# Altium integrated library Weidmueller_OMNIMATE_Signal.IntLib: 2550 symbols (part 1 of 45)
Pins are listed as number, name and electrical type; pins without a type are passive.

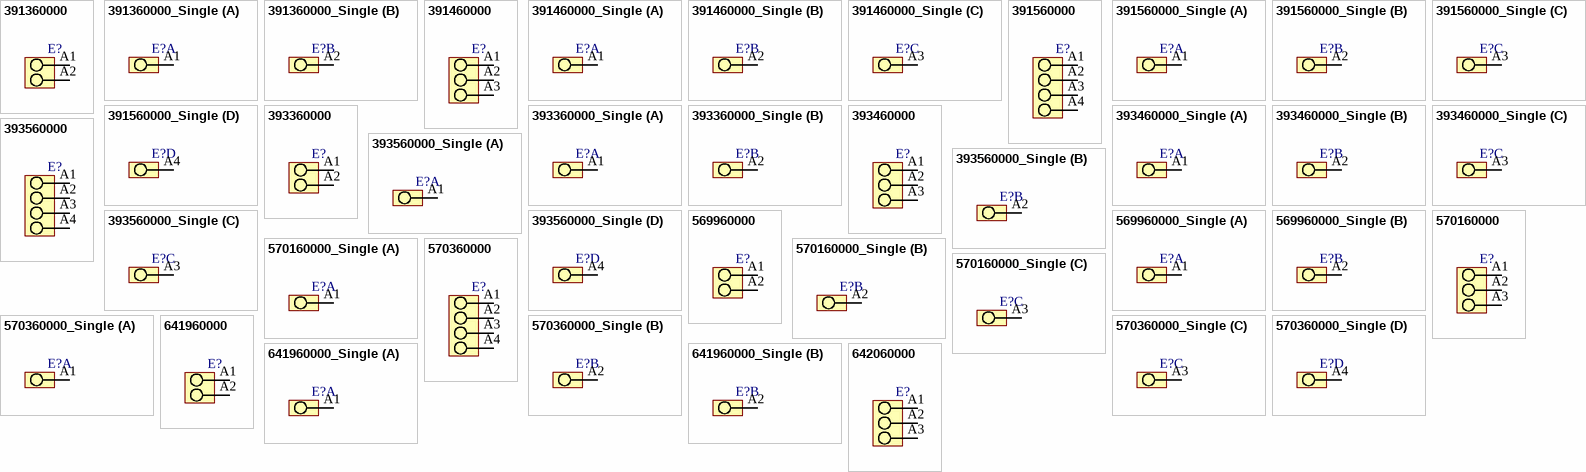
[diagram p0: symbols 391360000 to 642060000]

## 391360000
designator E?
OMNIMATE Signal - series TOP1.5GS; PartNumber: 391360000; Manufacturer: Weidmueller; Short_text_for_material: TOP1.5GS2/180 7 2STI OR; Side_termination_characteristic: closed side; Mounting_onto_the_PCB: Solder connection; Pitch_mm: 7,62 mm; Pitch_inch: 0,3 inch; No_of_poles: 2; Solder_pin_length_mm: 4,5 mm; Contact_material: CuZn; Contact_surface: tinned; Insulating_material: PA; UL_94_flammability_rating: V-2; Rated_voltage_for_surge_voltage_class_pollution_degree_II_2: 1000 V; Solid_min_H05_07_V_U: 0,5 mm²; Solid_max_H05_07_V_U: 2,5 mm²; Rated_voltage_use_group_B_UL_1059: 300 V; Rated_current_use_group_B_UL_1059: 10 A; Wire_cross_section_AWG_min_UL_1059: AWG 26; Wire_cross_section_AWG_max_UL_1059: AWG 14; PackageReference: TOP_1_5GS_180_7_62_02; Colour: Orange; Packaging: Box; Qty: 100 PCS; Revision: V1; ComponentLink1Description: Manufacturer URL; ComponentLink1URL: http://www.weidmueller.com/; ComponentLink2Description: URL Link1; ComponentLink2URL: http://catalog.weidmueller.com/catalog/Start.do?localeId=en&ObjectID=391360000
footprint TOP_1_5GS_180_7_62_02 (OMNIMATE Signal - Serie TOP1.5GS  TOP1.5GS2/180 7 2)
pins: A1, A2
1 alternate drawing of the same symbol

## 391360000_Single
designator E?
OMNIMATE Signal - series TOP1.5GS; PartNumber: 391360000; Manufacturer: Weidmueller; Short_text_for_material: TOP1.5GS2/180 7 2STI OR; Side_termination_characteristic: closed side; Mounting_onto_the_PCB: Solder connection; Pitch_mm: 7,62 mm; Pitch_inch: 0,3 inch; No_of_poles: 2; Solder_pin_length_mm: 4,5 mm; Contact_material: CuZn; Contact_surface: tinned; Insulating_material: PA; UL_94_flammability_rating: V-2; Rated_voltage_for_surge_voltage_class_pollution_degree_II_2: 1000 V; Solid_min_H05_07_V_U: 0,5 mm²; Solid_max_H05_07_V_U: 2,5 mm²; Rated_voltage_use_group_B_UL_1059: 300 V; Rated_current_use_group_B_UL_1059: 10 A; Wire_cross_section_AWG_min_UL_1059: AWG 26; Wire_cross_section_AWG_max_UL_1059: AWG 14; PackageReference: TOP_1_5GS_180_7_62_02; Colour: Orange; Packaging: Box; Qty: 100 PCS; Revision: V1; ComponentLink1Description: Manufacturer URL; ComponentLink1URL: http://www.weidmueller.com/; ComponentLink2Description: URL Link1; ComponentLink2URL: http://catalog.weidmueller.com/catalog/Start.do?localeId=en&ObjectID=391360000
footprint TOP_1_5GS_180_7_62_02 (OMNIMATE Signal - Serie TOP1.5GS  TOP1.5GS2/180 7 2)
part A pins: A1
part B pins: A2
1 alternate drawing of the same symbol

## 391460000
designator E?
OMNIMATE Signal - series TOP1.5GS; PartNumber: 391460000; Manufacturer: Weidmueller; Short_text_for_material: TOP1.5GS3/180 7 2STI OR; Side_termination_characteristic: closed side; Mounting_onto_the_PCB: Solder connection; Pitch_mm: 7,62 mm; Pitch_inch: 0,3 inch; No_of_poles: 3; Solder_pin_length_mm: 4,5 mm; Contact_material: CuZn; Contact_surface: tinned; Insulating_material: PA; UL_94_flammability_rating: V-2; Rated_voltage_for_surge_voltage_class_pollution_degree_II_2: 1000 V; Solid_min_H05_07_V_U: 0,5 mm²; Solid_max_H05_07_V_U: 2,5 mm²; Rated_voltage_use_group_B_UL_1059: 300 V; Rated_current_use_group_B_UL_1059: 10 A; Wire_cross_section_AWG_min_UL_1059: AWG 26; Wire_cross_section_AWG_max_UL_1059: AWG 14; PackageReference: TOP_1_5GS_180_7_62_03; Colour: Orange; Packaging: Box; Qty: 50 PCS; Revision: V1; ComponentLink1Description: Manufacturer URL; ComponentLink1URL: http://www.weidmueller.com/; ComponentLink2Description: URL Link1; ComponentLink2URL: http://catalog.weidmueller.com/catalog/Start.do?localeId=en&ObjectID=391460000
footprint TOP_1_5GS_180_7_62_03 (OMNIMATE Signal - Serie TOP1.5GS  TOP1.5GS3/180 7 2)
pins: A1, A2, A3
1 alternate drawing of the same symbol

## 391460000_Single
designator E?
OMNIMATE Signal - series TOP1.5GS; PartNumber: 391460000; Manufacturer: Weidmueller; Short_text_for_material: TOP1.5GS3/180 7 2STI OR; Side_termination_characteristic: closed side; Mounting_onto_the_PCB: Solder connection; Pitch_mm: 7,62 mm; Pitch_inch: 0,3 inch; No_of_poles: 3; Solder_pin_length_mm: 4,5 mm; Contact_material: CuZn; Contact_surface: tinned; Insulating_material: PA; UL_94_flammability_rating: V-2; Rated_voltage_for_surge_voltage_class_pollution_degree_II_2: 1000 V; Solid_min_H05_07_V_U: 0,5 mm²; Solid_max_H05_07_V_U: 2,5 mm²; Rated_voltage_use_group_B_UL_1059: 300 V; Rated_current_use_group_B_UL_1059: 10 A; Wire_cross_section_AWG_min_UL_1059: AWG 26; Wire_cross_section_AWG_max_UL_1059: AWG 14; PackageReference: TOP_1_5GS_180_7_62_03; Colour: Orange; Packaging: Box; Qty: 50 PCS; Revision: V1; ComponentLink1Description: Manufacturer URL; ComponentLink1URL: http://www.weidmueller.com/; ComponentLink2Description: URL Link1; ComponentLink2URL: http://catalog.weidmueller.com/catalog/Start.do?localeId=en&ObjectID=391460000
footprint TOP_1_5GS_180_7_62_03 (OMNIMATE Signal - Serie TOP1.5GS  TOP1.5GS3/180 7 2)
part A pins: A1
part B pins: A2
part C pins: A3
1 alternate drawing of the same symbol

## 391560000
designator E?
OMNIMATE Signal - series TOP1.5GS; PartNumber: 391560000; Manufacturer: Weidmueller; Short_text_for_material: TOP1.5GS4/180 7 2STI OR; Side_termination_characteristic: closed side; Mounting_onto_the_PCB: Solder connection; Pitch_mm: 7,62 mm; Pitch_inch: 0,3 inch; No_of_poles: 4; Solder_pin_length_mm: 4,5 mm; Contact_material: CuZn; Contact_surface: tinned; Insulating_material: PA; UL_94_flammability_rating: V-2; Rated_voltage_for_surge_voltage_class_pollution_degree_II_2: 1000 V; Solid_min_H05_07_V_U: 0,5 mm²; Solid_max_H05_07_V_U: 2,5 mm²; Rated_voltage_use_group_B_UL_1059: 300 V; Rated_current_use_group_B_UL_1059: 10 A; Wire_cross_section_AWG_min_UL_1059: AWG 26; Wire_cross_section_AWG_max_UL_1059: AWG 14; PackageReference: TOP_1_5GS_180_7_62_04; Colour: Orange; Packaging: Box; Qty: 50 PCS; Revision: V1; ComponentLink1Description: Manufacturer URL; ComponentLink1URL: http://www.weidmueller.com/; ComponentLink2Description: URL Link1; ComponentLink2URL: http://catalog.weidmueller.com/catalog/Start.do?localeId=en&ObjectID=391560000
footprint TOP_1_5GS_180_7_62_04 (OMNIMATE Signal - Serie TOP1.5GS  TOP1.5GS4/180 7 2)
pins: A1, A2, A3, A4
1 alternate drawing of the same symbol

## 391560000_Single
designator E?
OMNIMATE Signal - series TOP1.5GS; PartNumber: 391560000; Manufacturer: Weidmueller; Short_text_for_material: TOP1.5GS4/180 7 2STI OR; Side_termination_characteristic: closed side; Mounting_onto_the_PCB: Solder connection; Pitch_mm: 7,62 mm; Pitch_inch: 0,3 inch; No_of_poles: 4; Solder_pin_length_mm: 4,5 mm; Contact_material: CuZn; Contact_surface: tinned; Insulating_material: PA; UL_94_flammability_rating: V-2; Rated_voltage_for_surge_voltage_class_pollution_degree_II_2: 1000 V; Solid_min_H05_07_V_U: 0,5 mm²; Solid_max_H05_07_V_U: 2,5 mm²; Rated_voltage_use_group_B_UL_1059: 300 V; Rated_current_use_group_B_UL_1059: 10 A; Wire_cross_section_AWG_min_UL_1059: AWG 26; Wire_cross_section_AWG_max_UL_1059: AWG 14; PackageReference: TOP_1_5GS_180_7_62_04; Colour: Orange; Packaging: Box; Qty: 50 PCS; Revision: V1; ComponentLink1Description: Manufacturer URL; ComponentLink1URL: http://www.weidmueller.com/; ComponentLink2Description: URL Link1; ComponentLink2URL: http://catalog.weidmueller.com/catalog/Start.do?localeId=en&ObjectID=391560000
footprint TOP_1_5GS_180_7_62_04 (OMNIMATE Signal - Serie TOP1.5GS  TOP1.5GS4/180 7 2)
part A pins: A1
part B pins: A2
part C pins: A3
part D pins: A4
1 alternate drawing of the same symbol

## 393360000
designator E?
OMNIMATE Signal - series TOP1.5GS; PartNumber: 393360000; Manufacturer: Weidmueller; Short_text_for_material: TOP1.5GS2/90 7 2STI OR; Side_termination_characteristic: closed side; Mounting_onto_the_PCB: Solder connection; Pitch_mm: 7,62 mm; Pitch_inch: 0,3 inch; No_of_poles: 2; Solder_pin_length_mm: 3,5 mm; Contact_material: CuZn; Contact_surface: tinned; Insulating_material: PA; UL_94_flammability_rating: V-2; Rated_voltage_for_surge_voltage_class_pollution_degree_II_2: 1000 V; Solid_min_H05_07_V_U: 0,5 mm²; Solid_max_H05_07_V_U: 2,5 mm²; Rated_voltage_use_group_B_UL_1059: 300 V; Rated_current_use_group_B_UL_1059: 10 A; Wire_cross_section_AWG_min_UL_1059: AWG 26; Wire_cross_section_AWG_max_UL_1059: AWG 14; PackageReference: TOP_1_5GS_90_7_62_02; Colour: Orange; Packaging: Box; Qty: 100 PCS; Revision: V1; ComponentLink1Description: Manufacturer URL; ComponentLink1URL: http://www.weidmueller.com/; ComponentLink2Description: URL Link1; ComponentLink2URL: http://catalog.weidmueller.com/catalog/Start.do?localeId=en&ObjectID=393360000
footprint TOP_1_5GS_90_7_62_02 (OMNIMATE Signal - Serie TOP1.5GS  TOP1.5GS2/90 7 2)
pins: A1, A2
1 alternate drawing of the same symbol

## 393360000_Single
designator E?
OMNIMATE Signal - series TOP1.5GS; PartNumber: 393360000; Manufacturer: Weidmueller; Short_text_for_material: TOP1.5GS2/90 7 2STI OR; Side_termination_characteristic: closed side; Mounting_onto_the_PCB: Solder connection; Pitch_mm: 7,62 mm; Pitch_inch: 0,3 inch; No_of_poles: 2; Solder_pin_length_mm: 3,5 mm; Contact_material: CuZn; Contact_surface: tinned; Insulating_material: PA; UL_94_flammability_rating: V-2; Rated_voltage_for_surge_voltage_class_pollution_degree_II_2: 1000 V; Solid_min_H05_07_V_U: 0,5 mm²; Solid_max_H05_07_V_U: 2,5 mm²; Rated_voltage_use_group_B_UL_1059: 300 V; Rated_current_use_group_B_UL_1059: 10 A; Wire_cross_section_AWG_min_UL_1059: AWG 26; Wire_cross_section_AWG_max_UL_1059: AWG 14; PackageReference: TOP_1_5GS_90_7_62_02; Colour: Orange; Packaging: Box; Qty: 100 PCS; Revision: V1; ComponentLink1Description: Manufacturer URL; ComponentLink1URL: http://www.weidmueller.com/; ComponentLink2Description: URL Link1; ComponentLink2URL: http://catalog.weidmueller.com/catalog/Start.do?localeId=en&ObjectID=393360000
footprint TOP_1_5GS_90_7_62_02 (OMNIMATE Signal - Serie TOP1.5GS  TOP1.5GS2/90 7 2)
part A pins: A1
part B pins: A2
1 alternate drawing of the same symbol

## 393460000
designator E?
OMNIMATE Signal - series TOP1.5GS; PartNumber: 393460000; Manufacturer: Weidmueller; Short_text_for_material: TOP1.5GS3/90 7 2STI OR; Side_termination_characteristic: closed side; Mounting_onto_the_PCB: Solder connection; Pitch_mm: 7,62 mm; Pitch_inch: 0,3 inch; No_of_poles: 3; Solder_pin_length_mm: 3,5 mm; Contact_material: CuZn; Contact_surface: tinned; Insulating_material: PA; UL_94_flammability_rating: V-2; Rated_voltage_for_surge_voltage_class_pollution_degree_II_2: 1000 V; Solid_min_H05_07_V_U: 0,5 mm²; Solid_max_H05_07_V_U: 2,5 mm²; Rated_voltage_use_group_B_UL_1059: 300 V; Rated_current_use_group_B_UL_1059: 10 A; Wire_cross_section_AWG_min_UL_1059: AWG 26; Wire_cross_section_AWG_max_UL_1059: AWG 14; PackageReference: TOP_1_5GS_90_7_62_03; Colour: Orange; Packaging: Box; Qty: 100 PCS; Revision: V1; ComponentLink1Description: Manufacturer URL; ComponentLink1URL: http://www.weidmueller.com/; ComponentLink2Description: URL Link1; ComponentLink2URL: http://catalog.weidmueller.com/catalog/Start.do?localeId=en&ObjectID=393460000
footprint TOP_1_5GS_90_7_62_03 (OMNIMATE Signal - Serie TOP1.5GS  TOP1.5GS3/90 7 2)
pins: A1, A2, A3
1 alternate drawing of the same symbol

## 393460000_Single
designator E?
OMNIMATE Signal - series TOP1.5GS; PartNumber: 393460000; Manufacturer: Weidmueller; Short_text_for_material: TOP1.5GS3/90 7 2STI OR; Side_termination_characteristic: closed side; Mounting_onto_the_PCB: Solder connection; Pitch_mm: 7,62 mm; Pitch_inch: 0,3 inch; No_of_poles: 3; Solder_pin_length_mm: 3,5 mm; Contact_material: CuZn; Contact_surface: tinned; Insulating_material: PA; UL_94_flammability_rating: V-2; Rated_voltage_for_surge_voltage_class_pollution_degree_II_2: 1000 V; Solid_min_H05_07_V_U: 0,5 mm²; Solid_max_H05_07_V_U: 2,5 mm²; Rated_voltage_use_group_B_UL_1059: 300 V; Rated_current_use_group_B_UL_1059: 10 A; Wire_cross_section_AWG_min_UL_1059: AWG 26; Wire_cross_section_AWG_max_UL_1059: AWG 14; PackageReference: TOP_1_5GS_90_7_62_03; Colour: Orange; Packaging: Box; Qty: 100 PCS; Revision: V1; ComponentLink1Description: Manufacturer URL; ComponentLink1URL: http://www.weidmueller.com/; ComponentLink2Description: URL Link1; ComponentLink2URL: http://catalog.weidmueller.com/catalog/Start.do?localeId=en&ObjectID=393460000
footprint TOP_1_5GS_90_7_62_03 (OMNIMATE Signal - Serie TOP1.5GS  TOP1.5GS3/90 7 2)
part A pins: A1
part B pins: A2
part C pins: A3
1 alternate drawing of the same symbol

## 393560000
designator E?
OMNIMATE Signal - series TOP1.5GS; PartNumber: 393560000; Manufacturer: Weidmueller; Short_text_for_material: TOP1.5GS4/90 7 2STI OR; Side_termination_characteristic: closed side; Mounting_onto_the_PCB: Solder connection; Pitch_mm: 7,62 mm; Pitch_inch: 0,3 inch; No_of_poles: 4; Solder_pin_length_mm: 3,5 mm; Contact_material: CuZn; Contact_surface: tinned; Insulating_material: PA; UL_94_flammability_rating: V-2; Rated_voltage_for_surge_voltage_class_pollution_degree_II_2: 1000 V; Solid_min_H05_07_V_U: 0,5 mm²; Solid_max_H05_07_V_U: 2,5 mm²; Rated_voltage_use_group_B_UL_1059: 300 V; Rated_current_use_group_B_UL_1059: 10 A; Wire_cross_section_AWG_min_UL_1059: AWG 26; Wire_cross_section_AWG_max_UL_1059: AWG 14; PackageReference: TOP_1_5GS_90_7_62_04; Colour: Orange; Packaging: Box; Qty: 50 PCS; Revision: V1; ComponentLink1Description: Manufacturer URL; ComponentLink1URL: http://www.weidmueller.com/; ComponentLink2Description: URL Link1; ComponentLink2URL: http://catalog.weidmueller.com/catalog/Start.do?localeId=en&ObjectID=393560000
footprint TOP_1_5GS_90_7_62_04 (OMNIMATE Signal - Serie TOP1.5GS  TOP1.5GS4/90 7 2)
pins: A1, A2, A3, A4
1 alternate drawing of the same symbol

## 393560000_Single
designator E?
OMNIMATE Signal - series TOP1.5GS; PartNumber: 393560000; Manufacturer: Weidmueller; Short_text_for_material: TOP1.5GS4/90 7 2STI OR; Side_termination_characteristic: closed side; Mounting_onto_the_PCB: Solder connection; Pitch_mm: 7,62 mm; Pitch_inch: 0,3 inch; No_of_poles: 4; Solder_pin_length_mm: 3,5 mm; Contact_material: CuZn; Contact_surface: tinned; Insulating_material: PA; UL_94_flammability_rating: V-2; Rated_voltage_for_surge_voltage_class_pollution_degree_II_2: 1000 V; Solid_min_H05_07_V_U: 0,5 mm²; Solid_max_H05_07_V_U: 2,5 mm²; Rated_voltage_use_group_B_UL_1059: 300 V; Rated_current_use_group_B_UL_1059: 10 A; Wire_cross_section_AWG_min_UL_1059: AWG 26; Wire_cross_section_AWG_max_UL_1059: AWG 14; PackageReference: TOP_1_5GS_90_7_62_04; Colour: Orange; Packaging: Box; Qty: 50 PCS; Revision: V1; ComponentLink1Description: Manufacturer URL; ComponentLink1URL: http://www.weidmueller.com/; ComponentLink2Description: URL Link1; ComponentLink2URL: http://catalog.weidmueller.com/catalog/Start.do?localeId=en&ObjectID=393560000
footprint TOP_1_5GS_90_7_62_04 (OMNIMATE Signal - Serie TOP1.5GS  TOP1.5GS4/90 7 2)
part A pins: A1
part B pins: A2
part C pins: A3
part D pins: A4
1 alternate drawing of the same symbol

## 569960000
designator E?
OMNIMATE Signal - series TOP1.5GS; PartNumber: 569960000; Manufacturer: Weidmueller; Short_text_for_material: TOP1.5GS2/180 5 2STI OR; Side_termination_characteristic: closed side; Mounting_onto_the_PCB: Solder connection; Pitch_mm: 5,08 mm; Pitch_inch: 0,2 inch; No_of_poles: 2; Solder_pin_length_mm: 4,5 mm; Contact_material: CuZn; Contact_surface: tinned; Insulating_material: PA; UL_94_flammability_rating: V-2; Rated_voltage_for_surge_voltage_class_pollution_degree_II_2: 630 V; Solid_min_H05_07_V_U: 0,5 mm²; Solid_max_H05_07_V_U: 2,5 mm²; Rated_voltage_use_group_B_UL_1059: 300 V; Rated_current_use_group_B_UL_1059: 10 A; Wire_cross_section_AWG_min_UL_1059: AWG 26; Wire_cross_section_AWG_max_UL_1059: AWG 14; PackageReference: TOP_1_5GS_180_5_08_02; Colour: Orange; Packaging: Box; Qty: 100 PCS; Revision: V1; ComponentLink1Description: Manufacturer URL; ComponentLink1URL: http://www.weidmueller.com/; ComponentLink2Description: URL Link1; ComponentLink2URL: http://catalog.weidmueller.com/catalog/Start.do?localeId=en&ObjectID=569960000
footprint TOP_1_5GS_180_5_08_02 (OMNIMATE Signal - Serie TOP1.5GS  TOP1.5GS3/180 5 2)
pins: A1, A2
1 alternate drawing of the same symbol

## 569960000_Single
designator E?
OMNIMATE Signal - series TOP1.5GS; PartNumber: 569960000; Manufacturer: Weidmueller; Short_text_for_material: TOP1.5GS2/180 5 2STI OR; Side_termination_characteristic: closed side; Mounting_onto_the_PCB: Solder connection; Pitch_mm: 5,08 mm; Pitch_inch: 0,2 inch; No_of_poles: 2; Solder_pin_length_mm: 4,5 mm; Contact_material: CuZn; Contact_surface: tinned; Insulating_material: PA; UL_94_flammability_rating: V-2; Rated_voltage_for_surge_voltage_class_pollution_degree_II_2: 630 V; Solid_min_H05_07_V_U: 0,5 mm²; Solid_max_H05_07_V_U: 2,5 mm²; Rated_voltage_use_group_B_UL_1059: 300 V; Rated_current_use_group_B_UL_1059: 10 A; Wire_cross_section_AWG_min_UL_1059: AWG 26; Wire_cross_section_AWG_max_UL_1059: AWG 14; PackageReference: TOP_1_5GS_180_5_08_02; Colour: Orange; Packaging: Box; Qty: 100 PCS; Revision: V1; ComponentLink1Description: Manufacturer URL; ComponentLink1URL: http://www.weidmueller.com/; ComponentLink2Description: URL Link1; ComponentLink2URL: http://catalog.weidmueller.com/catalog/Start.do?localeId=en&ObjectID=569960000
footprint TOP_1_5GS_180_5_08_02 (OMNIMATE Signal - Serie TOP1.5GS  TOP1.5GS3/180 5 2)
part A pins: A1
part B pins: A2
1 alternate drawing of the same symbol

## 570160000
designator E?
OMNIMATE Signal - series TOP1.5GS; PartNumber: 570160000; Manufacturer: Weidmueller; Short_text_for_material: TOP1.5GS3/180 5 2STI OR; Side_termination_characteristic: closed side; Mounting_onto_the_PCB: Solder connection; Pitch_mm: 5,08 mm; Pitch_inch: 0,2 inch; No_of_poles: 3; Solder_pin_length_mm: 4,5 mm; Contact_material: CuZn; Contact_surface: tinned; Insulating_material: PA; UL_94_flammability_rating: V-2; Rated_voltage_for_surge_voltage_class_pollution_degree_II_2: 630 V; Solid_min_H05_07_V_U: 0,5 mm²; Solid_max_H05_07_V_U: 2,5 mm²; Rated_voltage_use_group_B_UL_1059: 300 V; Rated_current_use_group_B_UL_1059: 10 A; Wire_cross_section_AWG_min_UL_1059: AWG 26; Wire_cross_section_AWG_max_UL_1059: AWG 14; PackageReference: TOP_1_5GS_180_5_08_03; Colour: Orange; Packaging: Box; Qty: 100 PCS; Revision: V1; ComponentLink1Description: Manufacturer URL; ComponentLink1URL: http://www.weidmueller.com/; ComponentLink2Description: URL Link1; ComponentLink2URL: http://catalog.weidmueller.com/catalog/Start.do?localeId=en&ObjectID=570160000
footprint TOP_1_5GS_180_5_08_03 (OMNIMATE Signal - Serie TOP1.5GS  TOP1.5GS3/180 5 2)
pins: A1, A2, A3
1 alternate drawing of the same symbol

## 570160000_Single
designator E?
OMNIMATE Signal - series TOP1.5GS; PartNumber: 570160000; Manufacturer: Weidmueller; Short_text_for_material: TOP1.5GS3/180 5 2STI OR; Side_termination_characteristic: closed side; Mounting_onto_the_PCB: Solder connection; Pitch_mm: 5,08 mm; Pitch_inch: 0,2 inch; No_of_poles: 3; Solder_pin_length_mm: 4,5 mm; Contact_material: CuZn; Contact_surface: tinned; Insulating_material: PA; UL_94_flammability_rating: V-2; Rated_voltage_for_surge_voltage_class_pollution_degree_II_2: 630 V; Solid_min_H05_07_V_U: 0,5 mm²; Solid_max_H05_07_V_U: 2,5 mm²; Rated_voltage_use_group_B_UL_1059: 300 V; Rated_current_use_group_B_UL_1059: 10 A; Wire_cross_section_AWG_min_UL_1059: AWG 26; Wire_cross_section_AWG_max_UL_1059: AWG 14; PackageReference: TOP_1_5GS_180_5_08_03; Colour: Orange; Packaging: Box; Qty: 100 PCS; Revision: V1; ComponentLink1Description: Manufacturer URL; ComponentLink1URL: http://www.weidmueller.com/; ComponentLink2Description: URL Link1; ComponentLink2URL: http://catalog.weidmueller.com/catalog/Start.do?localeId=en&ObjectID=570160000
footprint TOP_1_5GS_180_5_08_03 (OMNIMATE Signal - Serie TOP1.5GS  TOP1.5GS3/180 5 2)
part A pins: A1
part B pins: A2
part C pins: A3
1 alternate drawing of the same symbol

## 570360000
designator E?
OMNIMATE Signal - series TOP1.5GS; PartNumber: 570360000; Manufacturer: Weidmueller; Short_text_for_material: TOP1.5GS4/180 5 2STI OR; Side_termination_characteristic: closed side; Mounting_onto_the_PCB: Solder connection; Pitch_mm: 5,08 mm; Pitch_inch: 0,2 inch; No_of_poles: 4; Solder_pin_length_mm: 4,5 mm; Contact_material: CuZn; Contact_surface: tinned; Insulating_material: PA; UL_94_flammability_rating: V-2; Rated_voltage_for_surge_voltage_class_pollution_degree_II_2: 630 V; Solid_min_H05_07_V_U: 0,5 mm²; Solid_max_H05_07_V_U: 2,5 mm²; Rated_voltage_use_group_B_UL_1059: 300 V; Rated_current_use_group_B_UL_1059: 10 A; Wire_cross_section_AWG_min_UL_1059: AWG 26; Wire_cross_section_AWG_max_UL_1059: AWG 14; PackageReference: TOP_1_5GS_180_5_08_04; Colour: Orange; Packaging: Box; Qty: 50 PCS; Revision: V1; ComponentLink1Description: Manufacturer URL; ComponentLink1URL: http://www.weidmueller.com/; ComponentLink2Description: URL Link1; ComponentLink2URL: http://catalog.weidmueller.com/catalog/Start.do?localeId=en&ObjectID=570360000
footprint TOP_1_5GS_180_5_08_04 (OMNIMATE Signal - Serie TOP1.5GS  TOP1.5GS4/180 5 2)
pins: A1, A2, A3, A4
1 alternate drawing of the same symbol

## 570360000_Single
designator E?
OMNIMATE Signal - series TOP1.5GS; PartNumber: 570360000; Manufacturer: Weidmueller; Short_text_for_material: TOP1.5GS4/180 5 2STI OR; Side_termination_characteristic: closed side; Mounting_onto_the_PCB: Solder connection; Pitch_mm: 5,08 mm; Pitch_inch: 0,2 inch; No_of_poles: 4; Solder_pin_length_mm: 4,5 mm; Contact_material: CuZn; Contact_surface: tinned; Insulating_material: PA; UL_94_flammability_rating: V-2; Rated_voltage_for_surge_voltage_class_pollution_degree_II_2: 630 V; Solid_min_H05_07_V_U: 0,5 mm²; Solid_max_H05_07_V_U: 2,5 mm²; Rated_voltage_use_group_B_UL_1059: 300 V; Rated_current_use_group_B_UL_1059: 10 A; Wire_cross_section_AWG_min_UL_1059: AWG 26; Wire_cross_section_AWG_max_UL_1059: AWG 14; PackageReference: TOP_1_5GS_180_5_08_04; Colour: Orange; Packaging: Box; Qty: 50 PCS; Revision: V1; ComponentLink1Description: Manufacturer URL; ComponentLink1URL: http://www.weidmueller.com/; ComponentLink2Description: URL Link1; ComponentLink2URL: http://catalog.weidmueller.com/catalog/Start.do?localeId=en&ObjectID=570360000
footprint TOP_1_5GS_180_5_08_04 (OMNIMATE Signal - Serie TOP1.5GS  TOP1.5GS4/180 5 2)
part A pins: A1
part B pins: A2
part C pins: A3
part D pins: A4
1 alternate drawing of the same symbol

## 641960000
designator E?
OMNIMATE Signal - series TOP1.5GS; PartNumber: 641960000; Manufacturer: Weidmueller; Short_text_for_material: TOP1.5GS2/90 5 2STI OR; Side_termination_characteristic: closed side; Mounting_onto_the_PCB: Solder connection; Pitch_mm: 5,08 mm; Pitch_inch: 0,2 inch; No_of_poles: 2; Solder_pin_length_mm: 3,5 mm; Contact_material: CuZn; Contact_surface: tinned; Insulating_material: PA; UL_94_flammability_rating: V-2; Rated_voltage_for_surge_voltage_class_pollution_degree_II_2: 630 V; Solid_min_H05_07_V_U: 0,5 mm²; Solid_max_H05_07_V_U: 2,5 mm²; Rated_voltage_use_group_B_UL_1059: 300 V; Rated_current_use_group_B_UL_1059: 10 A; Wire_cross_section_AWG_min_UL_1059: AWG 26; Wire_cross_section_AWG_max_UL_1059: AWG 14; PackageReference: TOP_1_5GS_90_5_08_02; Colour: Orange; Packaging: Box; Qty: 100 PCS; Revision: V1; ComponentLink1Description: Manufacturer URL; ComponentLink1URL: http://www.weidmueller.com/; ComponentLink2Description: URL Link1; ComponentLink2URL: http://catalog.weidmueller.com/catalog/Start.do?localeId=en&ObjectID=641960000
footprint TOP_1_5GS_90_5_08_02 (OMNIMATE Signal - Serie TOP1.5GS  TOP1.5GS2/90 5 2STI)
pins: A1, A2
1 alternate drawing of the same symbol

## 641960000_Single
designator E?
OMNIMATE Signal - series TOP1.5GS; PartNumber: 641960000; Manufacturer: Weidmueller; Short_text_for_material: TOP1.5GS2/90 5 2STI OR; Side_termination_characteristic: closed side; Mounting_onto_the_PCB: Solder connection; Pitch_mm: 5,08 mm; Pitch_inch: 0,2 inch; No_of_poles: 2; Solder_pin_length_mm: 3,5 mm; Contact_material: CuZn; Contact_surface: tinned; Insulating_material: PA; UL_94_flammability_rating: V-2; Rated_voltage_for_surge_voltage_class_pollution_degree_II_2: 630 V; Solid_min_H05_07_V_U: 0,5 mm²; Solid_max_H05_07_V_U: 2,5 mm²; Rated_voltage_use_group_B_UL_1059: 300 V; Rated_current_use_group_B_UL_1059: 10 A; Wire_cross_section_AWG_min_UL_1059: AWG 26; Wire_cross_section_AWG_max_UL_1059: AWG 14; PackageReference: TOP_1_5GS_90_5_08_02; Colour: Orange; Packaging: Box; Qty: 100 PCS; Revision: V1; ComponentLink1Description: Manufacturer URL; ComponentLink1URL: http://www.weidmueller.com/; ComponentLink2Description: URL Link1; ComponentLink2URL: http://catalog.weidmueller.com/catalog/Start.do?localeId=en&ObjectID=641960000
footprint TOP_1_5GS_90_5_08_02 (OMNIMATE Signal - Serie TOP1.5GS  TOP1.5GS2/90 5 2STI)
part A pins: A1
part B pins: A2
1 alternate drawing of the same symbol

## 642060000
designator E?
OMNIMATE Signal - series TOP1.5GS; PartNumber: 642060000; Manufacturer: Weidmueller; Short_text_for_material: TOP1.5GS3/90 5 2STI OR; Side_termination_characteristic: closed side; Mounting_onto_the_PCB: Solder connection; Pitch_mm: 5,08 mm; Pitch_inch: 0,2 inch; No_of_poles: 3; Solder_pin_length_mm: 3,5 mm; Contact_material: CuZn; Contact_surface: tinned; Insulating_material: PA; UL_94_flammability_rating: V-2; Rated_voltage_for_surge_voltage_class_pollution_degree_II_2: 630 V; Solid_min_H05_07_V_U: 0,5 mm²; Solid_max_H05_07_V_U: 2,5 mm²; Rated_voltage_use_group_B_UL_1059: 300 V; Rated_current_use_group_B_UL_1059: 10 A; Wire_cross_section_AWG_min_UL_1059: AWG 26; Wire_cross_section_AWG_max_UL_1059: AWG 14; PackageReference: TOP_1_5GS_90_5_08_03; Colour: Orange; Packaging: Box; Qty: 100 PCS; Revision: V1; ComponentLink1Description: Manufacturer URL; ComponentLink1URL: http://www.weidmueller.com/; ComponentLink2Description: URL Link1; ComponentLink2URL: http://catalog.weidmueller.com/catalog/Start.do?localeId=en&ObjectID=642060000
footprint TOP_1_5GS_90_5_08_03 (OMNIMATE Signal - Serie TOP1.5GS  TOP1.5GS3/90 5 2STI)
pins: A1, A2, A3
1 alternate drawing of the same symbol

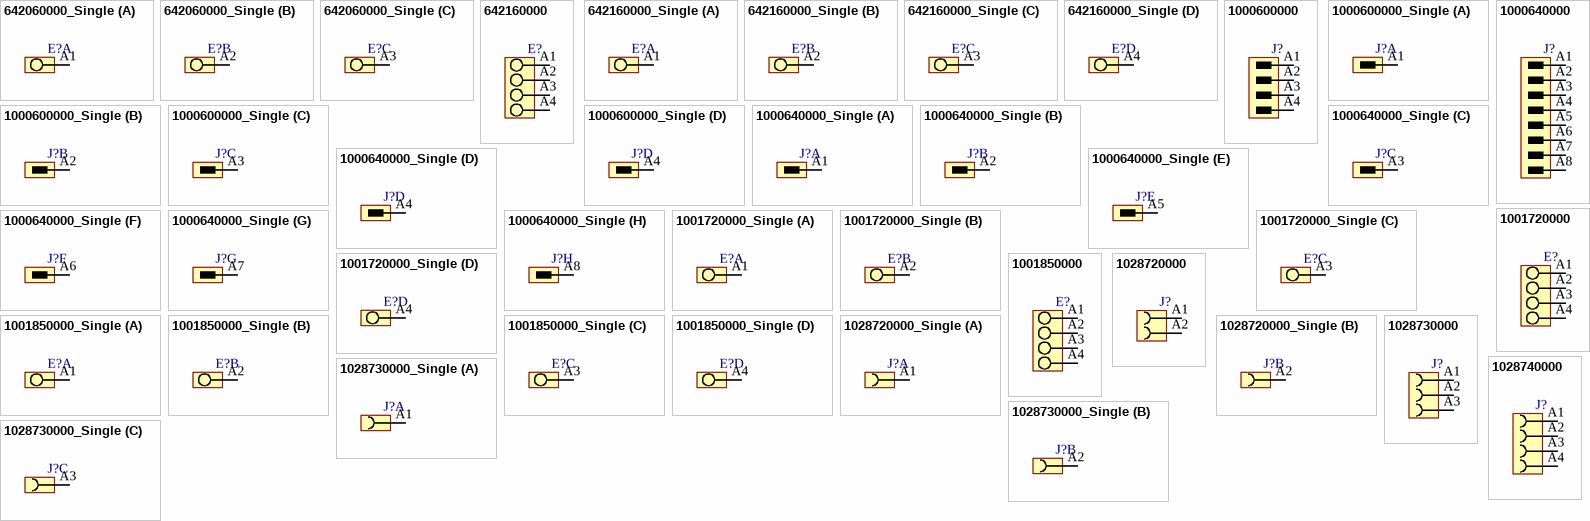
[diagram p1: symbols 642060000_Single to 1028740000]

## 642060000_Single
designator E?
OMNIMATE Signal - series TOP1.5GS; PartNumber: 642060000; Manufacturer: Weidmueller; Short_text_for_material: TOP1.5GS3/90 5 2STI OR; Side_termination_characteristic: closed side; Mounting_onto_the_PCB: Solder connection; Pitch_mm: 5,08 mm; Pitch_inch: 0,2 inch; No_of_poles: 3; Solder_pin_length_mm: 3,5 mm; Contact_material: CuZn; Contact_surface: tinned; Insulating_material: PA; UL_94_flammability_rating: V-2; Rated_voltage_for_surge_voltage_class_pollution_degree_II_2: 630 V; Solid_min_H05_07_V_U: 0,5 mm²; Solid_max_H05_07_V_U: 2,5 mm²; Rated_voltage_use_group_B_UL_1059: 300 V; Rated_current_use_group_B_UL_1059: 10 A; Wire_cross_section_AWG_min_UL_1059: AWG 26; Wire_cross_section_AWG_max_UL_1059: AWG 14; PackageReference: TOP_1_5GS_90_5_08_03; Colour: Orange; Packaging: Box; Qty: 100 PCS; Revision: V1; ComponentLink1Description: Manufacturer URL; ComponentLink1URL: http://www.weidmueller.com/; ComponentLink2Description: URL Link1; ComponentLink2URL: http://catalog.weidmueller.com/catalog/Start.do?localeId=en&ObjectID=642060000
footprint TOP_1_5GS_90_5_08_03 (OMNIMATE Signal - Serie TOP1.5GS  TOP1.5GS3/90 5 2STI)
part A pins: A1
part B pins: A2
part C pins: A3
1 alternate drawing of the same symbol

## 642160000
designator E?
OMNIMATE Signal - series TOP1.5GS; PartNumber: 642160000; Manufacturer: Weidmueller; Short_text_for_material: TOP1.5GS4/90 5 2STI OR; Side_termination_characteristic: closed side; Mounting_onto_the_PCB: Solder connection; Pitch_mm: 5,08 mm; Pitch_inch: 0,2 inch; No_of_poles: 4; Solder_pin_length_mm: 3,5 mm; Contact_material: CuZn; Contact_surface: tinned; Insulating_material: PA; UL_94_flammability_rating: V-2; Rated_voltage_for_surge_voltage_class_pollution_degree_II_2: 630 V; Solid_min_H05_07_V_U: 0,5 mm²; Solid_max_H05_07_V_U: 2,5 mm²; Rated_voltage_use_group_B_UL_1059: 300 V; Rated_current_use_group_B_UL_1059: 10 A; Wire_cross_section_AWG_min_UL_1059: AWG 26; Wire_cross_section_AWG_max_UL_1059: AWG 14; PackageReference: TOP_1_5GS_90_5_08_04; Colour: Orange; Packaging: Box; Qty: 50 PCS; Revision: V1; ComponentLink1Description: Manufacturer URL; ComponentLink1URL: http://www.weidmueller.com/; ComponentLink2Description: URL Link1; ComponentLink2URL: http://catalog.weidmueller.com/catalog/Start.do?localeId=en&ObjectID=642160000
footprint TOP_1_5GS_90_5_08_04 (OMNIMATE Signal - Serie TOP1.5GS  TOP1.5GS4/90 5 2STI)
pins: A1, A2, A3, A4
1 alternate drawing of the same symbol

## 642160000_Single
designator E?
OMNIMATE Signal - series TOP1.5GS; PartNumber: 642160000; Manufacturer: Weidmueller; Short_text_for_material: TOP1.5GS4/90 5 2STI OR; Side_termination_characteristic: closed side; Mounting_onto_the_PCB: Solder connection; Pitch_mm: 5,08 mm; Pitch_inch: 0,2 inch; No_of_poles: 4; Solder_pin_length_mm: 3,5 mm; Contact_material: CuZn; Contact_surface: tinned; Insulating_material: PA; UL_94_flammability_rating: V-2; Rated_voltage_for_surge_voltage_class_pollution_degree_II_2: 630 V; Solid_min_H05_07_V_U: 0,5 mm²; Solid_max_H05_07_V_U: 2,5 mm²; Rated_voltage_use_group_B_UL_1059: 300 V; Rated_current_use_group_B_UL_1059: 10 A; Wire_cross_section_AWG_min_UL_1059: AWG 26; Wire_cross_section_AWG_max_UL_1059: AWG 14; PackageReference: TOP_1_5GS_90_5_08_04; Colour: Orange; Packaging: Box; Qty: 50 PCS; Revision: V1; ComponentLink1Description: Manufacturer URL; ComponentLink1URL: http://www.weidmueller.com/; ComponentLink2Description: URL Link1; ComponentLink2URL: http://catalog.weidmueller.com/catalog/Start.do?localeId=en&ObjectID=642160000
footprint TOP_1_5GS_90_5_08_04 (OMNIMATE Signal - Serie TOP1.5GS  TOP1.5GS4/90 5 2STI)
part A pins: A1
part B pins: A2
part C pins: A3
part D pins: A4
1 alternate drawing of the same symbol

## 1000600000
designator J?
OMNIMATE Signal - series BL/SL 3.50; PartNumber: 1000600000; Manufacturer: Weidmueller; Short_text_for_material: SL-SMT 3.50/04/90RF 1.5SN BK BX; Side_termination_characteristic: Solder flange; Mounting_onto_the_PCB: Reflow solder connection; Pitch_mm: 3.5 mm; Pitch_inch: 0.138 inch; No_of_poles: 4; Outgoing_elbow: 90°; Solder_pin_length_mm: 1.5 mm; Contact_material: Cu-Leg; Contact_surface: tinned; Rated_voltage_use_group_B_UL_1059: 300 V; Rated_current_use_group_B_UL_1059: 10 A; PackageReference: SL_SMT_3_5_90RF_04; Colour: Black; Packaging: Box; Qty: 100 PCS; Revision: V1; ComponentLink1Description: Manufacturer URL; ComponentLink1URL: http://www.weidmueller.com/; ComponentLink2Description: URL Link1; ComponentLink2URL: http://catalog.weidmueller.com/catalog/Start.do?localeId=en&ObjectID=1000600000
footprint SL_SMT_3_5_90RF_04 (OMNIMATE Signal - Serie BL/SL 3.50  SL-SMT 3.50/04/90RF 1.5)
pins: A1, A2, A3, A4

## 1000600000_Single
designator J?
OMNIMATE Signal - series BL/SL 3.50; PartNumber: 1000600000; Manufacturer: Weidmueller; Short_text_for_material: SL-SMT 3.50/04/90RF 1.5SN BK BX; Side_termination_characteristic: Solder flange; Mounting_onto_the_PCB: Reflow solder connection; Pitch_mm: 3.5 mm; Pitch_inch: 0.138 inch; No_of_poles: 4; Outgoing_elbow: 90°; Solder_pin_length_mm: 1.5 mm; Contact_material: Cu-Leg; Contact_surface: tinned; Rated_voltage_use_group_B_UL_1059: 300 V; Rated_current_use_group_B_UL_1059: 10 A; PackageReference: SL_SMT_3_5_90RF_04; Colour: Black; Packaging: Box; Qty: 100 PCS; Revision: V1; ComponentLink1Description: Manufacturer URL; ComponentLink1URL: http://www.weidmueller.com/; ComponentLink2Description: URL Link1; ComponentLink2URL: http://catalog.weidmueller.com/catalog/Start.do?localeId=en&ObjectID=1000600000
footprint SL_SMT_3_5_90RF_04 (OMNIMATE Signal - Serie BL/SL 3.50  SL-SMT 3.50/04/90RF 1.5)
part A pins: A1
part B pins: A2
part C pins: A3
part D pins: A4

## 1000640000
designator J?
OMNIMATE Signal - series BL/SL 3.50; PartNumber: 1000640000; Manufacturer: Weidmueller; Short_text_for_material: SL-SMT 3.50/08/90RF 1.5SN BK BX; Side_termination_characteristic: Solder flange; Mounting_onto_the_PCB: Reflow solder connection; Pitch_mm: 3.5 mm; Pitch_inch: 0.138 inch; No_of_poles: 8; Outgoing_elbow: 90°; Solder_pin_length_mm: 1.5 mm; Contact_material: Cu-Leg; Contact_surface: tinned; Rated_voltage_use_group_B_UL_1059: 300 V; Rated_current_use_group_B_UL_1059: 10 A; PackageReference: SL_SMT_3_5_90RF_08; Colour: Black; Packaging: Box; Qty: 50 PCS; Revision: V1; ComponentLink1Description: Manufacturer URL; ComponentLink1URL: http://www.weidmueller.com/; ComponentLink2Description: URL Link1; ComponentLink2URL: http://catalog.weidmueller.com/catalog/Start.do?localeId=en&ObjectID=1000640000
footprint SL_SMT_3_5_90RF_08 (OMNIMATE Signal - Serie BL/SL 3.50  SL-SMT 3.50/08/90RF 1.5)
pins: A1, A2, A3, A4, A5, A6, A7, A8

## 1000640000_Single
designator J?
OMNIMATE Signal - series BL/SL 3.50; PartNumber: 1000640000; Manufacturer: Weidmueller; Short_text_for_material: SL-SMT 3.50/08/90RF 1.5SN BK BX; Side_termination_characteristic: Solder flange; Mounting_onto_the_PCB: Reflow solder connection; Pitch_mm: 3.5 mm; Pitch_inch: 0.138 inch; No_of_poles: 8; Outgoing_elbow: 90°; Solder_pin_length_mm: 1.5 mm; Contact_material: Cu-Leg; Contact_surface: tinned; Rated_voltage_use_group_B_UL_1059: 300 V; Rated_current_use_group_B_UL_1059: 10 A; PackageReference: SL_SMT_3_5_90RF_08; Colour: Black; Packaging: Box; Qty: 50 PCS; Revision: V1; ComponentLink1Description: Manufacturer URL; ComponentLink1URL: http://www.weidmueller.com/; ComponentLink2Description: URL Link1; ComponentLink2URL: http://catalog.weidmueller.com/catalog/Start.do?localeId=en&ObjectID=1000640000
footprint SL_SMT_3_5_90RF_08 (OMNIMATE Signal - Serie BL/SL 3.50  SL-SMT 3.50/08/90RF 1.5)
part A pins: A1
part B pins: A2
part C pins: A3
part D pins: A4
part E pins: A5
part F pins: A6
part G pins: A7
part H pins: A8

## 1001720000
designator E?
OMNIMATE Signal - series LL; PartNumber: 1001720000; Manufacturer: Weidmueller; Short_text_for_material: LL 5.00/04/90 3.2SN OR BX; Side_termination_characteristic: closed side; Mounting_onto_the_PCB: Solder connection; Pitch_mm: 5 mm; Pitch_inch: 0,197 inch; No_of_poles: 4; Solder_pin_length_mm: 3,2 mm; Contact_material: Cu-Leg; Contact_surface: tinned; Insulating_material: Wemid (PA); UL_94_flammability_rating: V-0; Rated_voltage_for_surge_voltage_class_pollution_degree_II_2: 500 V; Solid_min_H05_07_V_U: 0,5 mm²; Solid_max_H05_07_V_U: 6 mm²; Rated_voltage_use_group_B_UL_1059: 300 V; Rated_current_use_group_B_UL_1059: 20 A; Wire_cross_section_AWG_min_UL_1059: AWG 28; Wire_cross_section_AWG_max_UL_1059: AWG 12; PackageReference: LL_5_00_90_04; Colour: Orange; Packaging: Box; Qty: 100 PCS; Revision: V1; ComponentLink1Description: Manufacturer URL; ComponentLink1URL: http://www.weidmueller.com/; ComponentLink2Description: URL Link1; ComponentLink2URL: http://catalog.weidmueller.com/catalog/Start.do?localeId=en&ObjectID=1001720000
footprint LL_5_00_90_04 (OMNIMATE Signal - Serie LL  LL 5.00/04/90 3.2)
pins: A1, A2, A3, A4
1 alternate drawing of the same symbol

## 1001720000_Single
designator E?